# Altium footprint library Control.PcbLib: 22 footprints (part 2 of 2)
Each footprint in its own frame and in the unit in brackets; x right, y up, seen from the top. Pads: shape width x height; smd on the part's side, far side on the other; paste and mask are expansions set on the pad; w line width, h text height; cw(c..) or ccw(c..) is an arc to the next point about the centre after c.
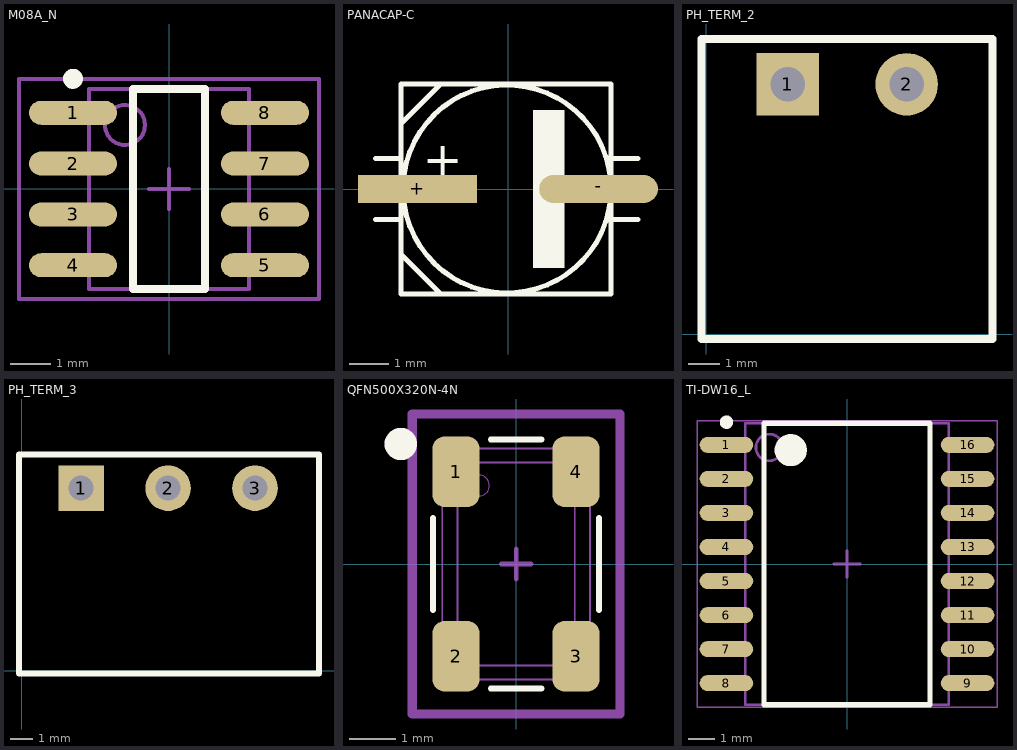
[diagram p1: the footprints below, top view; thin cyan lines are the x and y axes]

## M08A_N [mm] "SOIC, 8-Leads, Body 4.9x3.9mm, Pitch 1.27mm, IPC Medium Density"
height 1.75
pads (8):
  oval 2.2x0.6 smd: 1(-2.4,1.905) 2(-2.4,0.635) 3(-2.4,-0.635) 4(-2.4,-1.905) 5(2.4,-1.905) 6(2.4,-0.635) 7(2.4,0.635) 8(2.4,1.905)
Top Overlay:
  circle w0.25: c-2.4,2.755 r0.125
  lines w0.2: -0.9,-2.5 0.9,-2.5 0.9,2.5 -0.9,2.5 -0.9,-2.5
Mechanical 13:
  circle w0.1: c-1.1,1.6 r0.5
  lines w0.1: -2,-2.5 2,-2.5 2,2.5 -2,2.5 -2,-2.5
Mechanical 15:
  lines w0.1: -0.5,0 0.5,0 ; 0,-0.5 0,0.5 ; -3.75,-2.75 3.75,-2.75 3.75,2.75 -3.75,2.75 -3.75,-2.75
3D body: height 1.75, standoff 0, extent -2,-2.5 2,2.5

## PANACAP-C [mm]
pads (2):
  rect 3x0.7 smd: +(-2.286,0)
  oval 3x0.7 smd: -(2.286,0)
Top Overlay:
  circle w0.127: c-0.025,0 r2.625
  rectangle: 0.625,-2 1.425,2
  lines w0.127: -3.35,-0.775 -2.7,-0.775 ; -3.35,0.775 -2.7,0.775 ; -2.7,-1.65 -1.7,-2.65 ; -2.7,1.65 -1.7,2.65 ; 2.6,-0.775 3.275,-0.775 ; 2.6,0.775 3.275,0.775 ; -2.7,-2.65 -2.7,0 -2.7,2.65 2.6,2.65 2.6,-2.65 -2.7,-2.65
  text "+" at -2.15,0.325 h0.89
3D body: height 5.41, standoff 0, extent -2.95,-2.65 2.95,2.65

## PH_TERM_2 [mm] "Phoenix Terminal 2 way pluggable"
pads (2):
  rect 2x2 hole 1.1: 1(2.6,8)
  round 2 hole 1.1: 2(6.41,8)
Top Overlay:
  lines w0.254: -0.15,-0.15 -0.15,9.45 9.15,9.45 9.15,-0.15 -0.15,-0.15
3D body: height 7.25, standoff -3.4, extent 0,0 9.01,9.3

## PH_TERM_3 [mm] "Phoenix Terminal 3 way pluggable"
pads (3):
  rect 2x2 hole 1.1: 1(2.6,8)
  round 2 hole 1.1: 2(6.41,8) 3(10.22,8)
Top Overlay:
  lines w0.254: -0.125,-0.125 -0.125,9.475 13.025,9.475 13.025,-0.125 -0.125,-0.125
3D body: height 7.25, standoff -3.4, extent 0.025,0.025 12.845,9.325

## QFN500X320N-4N [mil] "QFN Oscillator 3.2mm x 5.0mm x 1.5mm"
height 59.06
pads (4):
  rrect50% 40x60 smd: 1(-51.18,78.74) 2(-51.18,-78.74) 3(51.18,-78.74) 4(51.18,78.74)
Top Overlay:
  circle w19.68: c-98.43,102.36 r3.94
  lines w5: -70.85,-39.37 -70.85,39.37 ; -21.65,-106.28 21.65,-106.28 ; -21.65,106.28 21.65,106.28 ; 70.85,-39.37 70.85,39.37
Mechanical 13:
  circle w1: c-31.48,66.92 r8.8
  lines w1.57: -62.98,-86.6 cw(c-64.97,-100.41) -51.17,-98.42 51.17,-98.42 cw(c64.97,-100.41) 62.98,-86.6 62.98,86.6 cw(c64.97,100.41) 51.17,98.42 -51.17,98.42 cw(c-64.97,100.41) -62.98,86.6 -62.98,-86.6 ; -50,-76.6 ccw(c-40,-76.6) -40,-86.6 40,-86.6 ccw(c40,-76.6) 50,-76.6 50,76.6 ccw(c40,76.6) 40,86.6 -40,86.6 ccw(c-40,76.6) -50,76.6 -50,-76.6
Mechanical 15:
  lines w3.94: -12.79,0 12.8,0 ; 0,-12.79 0,12.8
  lines w7.87: -88.58,-127.95 -88.58,127.95 88.58,127.95 88.58,-127.95 -88.58,-127.95
3D body: height 59.06, standoff 0, extent -62.99,-98.43 62.99,98.43

## TI-DW16_L [mm] "SOIC, 16-Leads, Body 10.5x7.6mm, Pitch 1.27mm, IPC High Density"
height 2.65
pads (16):
  oval 2x0.6 smd: 1(-4.5,4.445) 2(-4.5,3.175) 3(-4.5,1.905) 4(-4.5,0.635) 5(-4.5,-0.635) 6(-4.5,-1.905) 7(-4.5,-3.175) 8(-4.5,-4.445) 9(4.5,-4.445) 10(4.5,-3.175) 11(4.5,-1.905) 12(4.5,-0.635) 13(4.5,0.635) 14(4.5,1.905) 15(4.5,3.175) 16(4.5,4.445)
Top Overlay:
  circle w0.6: c-2.1,4.25 r0.3
  circle w0.25: c-4.5,5.295 r0.125
  lines w0.2: -3.1,-5.25 3.1,-5.25 3.1,5.25 -3.1,5.25 -3.1,-5.25
Mechanical 13:
  circle w0.1: c-2.9,4.35 r0.5
  lines w0.1: -3.8,-5.25 3.8,-5.25 3.8,5.25 -3.8,5.25 -3.8,-5.25
Mechanical 15:
  lines w0.05: -5.6,-5.35 5.6,-5.35 5.6,5.35 -5.6,5.35 -5.6,-5.35
  lines w0.1: -0.5,0 0.5,0 ; 0,-0.5 0,0.5
3D body: height 2, standoff 0, extent -5.082,-5.04 5.082,5.04